# Altium schematic symbol library LATTICEPLDS_Library.SchLib: 291 symbols (part 22 of 32) (continued)
## LFEC6/10/15/20-F484/FN484
designator U?
footprint fpBGA484
part A pins: AA1 PL25/34/42/46A, AA2 PL25/34/42/46B, B1 PLNC/8/8/8A/LUM0_PLLT_IN_A, B2 PLNC/3/3/3B, C1 PLNC/8/8/8B/LUM0_PLLC_IN_A, C2 PLNC/5/5/5B, C3 PLNC/3/3/3A, D1 PLNC/11/15/15B, D2 PLNC/7/7/7B, D3 PLNC/5/5/5A, D4 PL2/2/2/2A/VREF2_7, E1 PLNC/11/15/15A, E2 PLNC/9/9/9B/LUM0_PLLC_FB_A, E3 PLNC/7/7/7A, E4 PL2/2/2/2B/VREF1_7, E5 PLNC/4/4/4A, F1 PLNC/NC/14/14B, F2 PLNC/NC/14/14A, F3 PLNC/9/9/9A/LUM0_PLLT_FB_A, F4 PLNC/6/6/6A/LDQS, F5 PLNC/4/4/4B, G1 PL4/13/17/17B, G2 PL3/12/16/16B, G3 PLNC/NC/12/12A, G4 PLNC/6/6/6B, G5 PLNC/NC/11/11A, H1 PL6/15/19/19B, H2 PL4/13/17/17A, H3 PL3/12/16/16A, H4 PLNC/NC/12/12B, H5 PLNC/NC/13/13B, H6 PLNC/NC/11/11B, J1 PL9/18/22/22A/PCLKT7_0, J2 PL6/15/19/19A/LDQS, J3 PL5/14/18/18B, J4 PL5/14/18/18A, J5 PLNC/NC/13/13A, J8 VCCO7 (power), K1 PL9/18/22/22B/PCLKC7_0, K2 PL8/17/21/21B, K3 PL8/17/21/21A, K4 PL7/16/20/20A, K5 PL7/16/20/20B, K8 VCCO7 (power), L1 PL12/21/25/25B, L2 PL12/21/25/25A, L4 PL11/20/24/24A, L5 PL11/20/24/24B, L7 VCCO7 (power), L8 VCCO7 (power), M1 PL14/23/27/27A, M2 PL14/23/27/27B, M3 PL15/24/28/28B, M4 PL13/22/26/26A, M5 PL13/22/26/26B, M7 VCCO6 (power), M8 VCCO6 (power), N1 PL17/26/30/30A, N2 PL17/26/30/30B, N3 LDQS/PL15/24/28/28A, N4 PL16/25/29/29B, N5 PL16/25/29/29A, N8 VCCO6 (power), P1 PL18/27/31/31A, P2 PL18/27/31/31B, P3 PLNC/NC/33/33A, P4 PLNC/NC/33/33B, P5 PLNC/NC/32/32B, P8 VCCO6 (power), R1 PLNC/NC/34/34A, R2 PLNC/NC/34/34B, R3 PLNC/NC/NC/37A, R4 PLNC/NC/35/35B, R5 PLNC/NC/35/35A, R6 PLNC/NC/32/32A, T1 LDQS/PLNC/NC/NC/36A, T2 PLNC/NC/NC/36B, T3 PLNC/NC/NC/37B, U3 LLM0_PLLT_FB_A/PL21/30/38/42A, U4 PL22/31/39/43A, V1 LLM0_PLLT_IN_A/PL20/29/37/41A, V2 LLM0_PLLC_IN_A/PL20/29/37/41B, V3 LLM0_PLLC_FB_A/PL21/30/38/42B, V4 PL26/35/43/47B, V5 PL22/31/39/43B, W1 PL23/32/40/44A, W2 PL23/32/40/44B, W3 VREF1_6/PL27/36/44/48A, W4 PL26/35/43/47A, Y1 LDQS/PL24/33/41/45A, Y2 PL24/33/41/45B, Y3 VREF2_6/PL27/36/44/48B
part B pins: AA3 PBNC/NC/5/13A, AA4 PBNC/NC/9/17A, AA5 PBNC/NC/7/15A, AA6 PB9/17/17/25A, AA7 PB10/18/18/26B, AA8 PB10/18/18/26A, AA9 PB14/22/22/30B, AA10 PB14/22/22/30A/BDQS, AA11 PB15/23/23/31B, AA12 D2/SPID5/PB21/29/29/37A, AA13 PB25/33/33/41A, AA14 PB26/34/34/42A, AA15 PB30/38/38/46B, AA16 PB31/39/39/47B, AA17 PB32/40/40/48B, AA18 PB33/41/41/49B, AA19 PBNC/NC/45/53B, AA20 PBNC/NC/47/55A, AB3 PBNC/NC/5/13B, AB4 PBNC/NC/9/17B, AB5 PB9/17/17/25B, AB6 PB11/19/19/27A, AB7 PB11/19/19/27B, AB8 PB13/21/21/29A, AB9 PB13/21/21/29B, AB10 PB17/25/25/33A/PCLKT5_0, AB11 PB17/25/25/33B/PCLKC5_0, AB12 D1/SPID6/PB21/29/29/37B, AB13 D6/SPID1/PB25/33/33/41B, AB14 PB29/37/37/45A, AB15 PB29/37/37/45B, AB16 BDQS/PB30/38/38/46A, AB17 PB31/39/39/47A, AB18 PB32/40/40/48A, AB19 PB33/41/41/49A, AB20 PBNC/NC/45/53A, R9 VCCO5 (power), R10 VCCO5 (power), R11 VCCO5 (power), R12 VCCO4 (power), R13 VCCO4 (power), R14 VCCO4 (power), T6 PBNC/NC/2/10B, T9 PB6/14/14/22B, T10 PB8/16/16/24B, T11 VCCO5 (power), T12 VCCO4 (power), T13 BDQS/PB22/30/30/38A, T14 PB28/36/36/44B, T17 PBNC/NC/49/57A, U6 PBNC/NC/4/12B, U7 PBNC/NC/3/11B, U8 PB3/11/11/19B, U9 PB4/12/12/20B, U10 PB7/15/15/23B, U11 CS1N/PB18/26/26/34B, U12 CSN/PB19/27/27/35B, U13 D0/SPID7/PB20/28/28/36B, U14 D4/SPID3/PB23/31/31/39B, U15 PBNC/NC/42/50B, U16 PBNC/NC/43/51B, U17 PBNC/NC/49/57B, V6 PBNC/NC/6/14B, V7 PBNC/NC/2/10A, V8 PBNC/NC/3/11A, V9 PB6/14/14/22A/BDQS, V10 PB8/16/16/24A, V11 PB16/24/24/32A/VREF2_5, V12 PB16/24/24/32B/VREF1_5, V13 D3/SPID4/PB22/30/30/38B, V14 D5/SPID2/PB24/32/32/40B, V15 PB28/36/36/44A, V16 PBNC/NC/43/51A, V17 PBNC/NC/44/52B, W5 PBNC/NC/4/12A, W6 PBNC/NC/7/15B, W7 PB3/11/11/19A, W8 PB2/10/10/18B, W9 PB4/12/12/20A, W10 PB7/15/15/23A, W11 PB12/20/20/28B, W12 VREF1_4/PB19/27/27/35A, W13 VREF2_4/PB20/28/28/36A, W14 PB23/31/31/39A, W15 PB27/35/35/43B, W16 PBNC/NC/42/50A, W17 PBNC/NC/46/54B, W18 PBNC/NC/48/56B, Y4 PBNC/NC/8/16B, Y5 PBNC/NC/8/16A, Y6 PBNC/NC/6/14A/BDQS, Y7 PB2/10/10/18A, Y8 PB5/13/13/21A, Y9 PB5/13/13/21B, Y10 PB12/20/20/28A, Y11 PB15/23/23/31A, Y12 WRITEN/PB18/26/26/34A, Y13 PB24/32/32/40A, Y14 PB26/34/34/42B, Y15 PB27/35/35/43A, Y16 BDQS/PBNC/NC/46/54A, Y17 PBNC/NC/44/52A, Y18 PBNC/NC/48/56A, Y19 PBNC/NC/47/55B
part C pins: AA21 PR26/35/43/47B, AA22 PR24/33/41/45A/RDQS, AB21 PR26/35/43/47A, B21 PRNC/3/3/3A, B22 PRNC/3/3/3B, C20 PRNC/5/5/5A, C21 PRNC/5/5/5B, C22 RUM0_PLLT_FB_A/PRNC/9/9/9A, D19 VREF2_2/PR2/2/2/2A, D20 RDQS/PRNC/6/6/6A, D21 RUM0_PLLC_FB_A/PRNC/9/9/9B, D22 PRNC/11/15/15A, E18 PRNC/4/4/4A, E19 VREF1_2/PR2/2/2/2B, E20 PRNC/6/6/6B, E21 PRNC/11/15/15B, E22 PR3/12/16/16A, F18 PRNC/4/4/4B, F19 PRNC/7/7/7A, F20 PRNC/7/7/7B, F21 PR3/12/16/16B, F22 PR4/13/17/17A, G18 RUM0_PLLT_IN_A/PRNC/8/8/8A, G19 RUM0_PLLC_IN_A/PRNC/8/8/8B, G20 PRNC/NC/14/14A, G21 PRNC/NC/14/14B, G22 PR4/13/17/17B, H17 PRNC/NC/11/11B, H18 PRNC/NC/11/11A, H19 PRNC/NC/13/13A, H20 PRNC/NC/12/12A, H21 PR8/17/21/21A, H22 PR8/17/21/21B, J15 VCCO2 (power), J18 PRNC/NC/13/13B, J19 PRNC/NC/12/12B, J20 RDQS/PR6/15/19/19A, J21 PCLKT2_0/PR9/18/22/22A, J22 PCLKC2_0/PR9/18/22/22B, K15 VCCO2 (power), K18 PR5/14/18/18A, K19 PR5/14/18/18B, K20 PR6/15/19/19B, K21 PR11/20/24/24A, K22 PR11/20/24/24B, L15 VCCO2 (power), L16 VCCO2 (power), L18 PR7/16/20/20A, L19 PR7/16/20/20B, L20 PR15/24/28/28A/RDQS, L21 PR14/23/27/27B, L22 PR12/21/25/25A, M15 VCCO3 (power), M16 VCCO3 (power), M18 PR13/22/26/26B, M19 PR13/22/26/26A, M20 PR14/23/27/27A, M21 PR15/24/28/28B, M22 PR12/21/25/25B, N15 VCCO3 (power), N18 PR16/25/29/29A, N19 PR16/25/29/29B, N20 PRNC/NC/33/33A, N21 PR17/26/30/30B, N22 PR17/26/30/30A, P15 VCCO3 (power), P18 PRNC/NC/32/32A, P19 PRNC/NC/32/32B, P20 PRNC/NC/33/33B, P21 PR18/27/31/31B, P22 PR18/27/31/31A, R17 PRNC/NC/NC/37A, R18 PRNC/NC/NC/36A/RDQS, R19 PRNC/NC/NC/36B, R21 PRNC/NC/34/34B, R22 PRNC/NC/34/34A, T18 PRNC/NC/NC/37B, T22 PRNC/NC/35/35A, U20 PR23/32/40/44A/RLM0_PLLT_FB_A, U21 PR20/29/37/41B/BUSY, U22 PRNC/NC/35/35B, V19 PR25/34/42/46A, V20 PR23/32/40/44B/RLM0_PLLC_FB_A, V21 PR21/30/38/42B/DIN, V22 PR20/29/37/41A/D7/SPID0, W19 PR25/34/42/46B, W20 PR27/36/44/48B/VREF2_3, W21 PR22/31/39/43B/RLM0_PLLC_IN_A, W22 PR21/30/38/42A/DOUT/CSOB, Y20 PR27/36/44/48A/VREF1_3, Y21 PR24/33/41/45B, Y22 PR22/31/39/43A/RLM0_PLLT_IN_A
part D pins: A3 PTNC/5/5/13B, A4 PTNC/9/9/17B, A5 PT9/17/17/25B, A6 PT11/19/19/27A, A7 PT11/19/19/27B, A8 PT13/21/21/29A, A9 PT13/21/21/29B, A10 PCLKT0_0/PT17/25/25/33A, A11 PCLKC0_0/PT17/25/25/33B, A12 PT21/29/29/37B, A13 PT25/33/33/41B, A14 PT29/37/37/45A, A15 PT29/37/37/45B, A16 PT30/38/38/46A/TDQS, A17 PT31/39/39/47A, A18 PT32/40/40/48A, A19 PT33/41/41/49A, A20 PTNC/NC/45/53A, B3 PTNC/5/5/13A, B4 PTNC/9/9/17A, B5 PTNC/7/7/15A, B6 PT9/17/17/25A, B7 PT10/18/18/26B, B8 PT10/18/18/26A, B9 PT14/22/22/30B, B10 TDQS/PT14/22/22/30A, B11 PT15/23/23/31B, B12 PT21/29/29/37A, B13 PT25/33/33/41A, B14 PT26/34/34/42A, B15 PT30/38/38/46B, B16 PT31/39/39/47B, B17 PT32/40/40/48B, B18 PT33/41/41/49B, B19 PTNC/NC/45/53B, B20 PTNC/NC/47/55A, C4 PTNC/8/8/16B, C5 PTNC/8/8/16A, C6 TDQS/PTNC/6/6/14A, C7 PT2/10/10/18A, C8 PT5/13/13/21A, C9 PT5/13/13/21B, C10 PT12/20/20/28A, C11 PT15/23/23/31A, C12 PT18/26/26/34A, C13 PT24/32/32/40A, C14 PT26/34/34/42B, C15 PT27/35/35/43A, C16 PTNC/NC/46/54A/TDQS, C17 PTNC/NC/44/52A, C18 PTNC/NC/48/56A, C19 PTNC/NC/47/55B, D5 PTNC/4/4/12A, D6 PTNC/7/7/15B, D7 PT3/11/11/19A, D8 PT2/10/10/18B, D9 PT4/12/12/20A, D10 PT7/15/15/23A, D11 PT12/20/20/28B, D12 PT19/27/27/35A/VREF1_1, D13 PT20/28/28/36A, D14 PT23/31/31/39A, D15 PT27/35/35/43B, D16 PTNC/NC/42/50A, D17 PTNC/NC/46/54B, D18 PTNC/NC/48/56B, E6 PTNC/6/6/14B, E7 PTNC/2/2/10A, E8 PTNC/3/3/11A, E9 TDQS/PT6/14/14/22A, E10 PT8/16/16/24A, E11 VREF2_0/PT16/24/24/32A, E12 VREF1_0/PT16/24/24/32B, E13 PT22/30/30/38B, E14 PT24/32/32/40B, E15 PT28/36/36/44A, E16 PTNC/NC/43/51A, E17 PTNC/NC/44/52B, F6 PTNC/4/4/12B, F7 PTNC/3/3/11B, F8 PT3/11/11/19B, F9 PT4/12/12/20B, F10 PT7/15/15/23B, F11 PT18/26/26/34B, F12 PT19/27/27/35B/VREF2_1, F13 PT20/28/28/36B, F14 PT23/31/31/39B, F15 PTNC/NC/42/50B, F16 PTNC/NC/43/51B, F17 PTNC/NC/49/57A, G6 PTNC/2/2/10B, G9 PT6/14/14/22B, G10 PT8/16/16/24B, G11 VCCO0 (power), G12 VCCO1 (power), G13 PT22/30/30/38A/TDQS, G14 PT28/36/36/44B, G17 PTNC/NC/49/57B, H9 VCCO0 (power), H10 VCCO0 (power), H11 VCCO0 (power), H12 VCCO1 (power), H13 VCCO1 (power), H14 VCCO1 (power)
part E pins: A1 GND (power), A22 GND (power), AB1 GND (power), AB22 GND (power), G7 VCCAUX (power), G8 VCCAUX (power), G15 VCCAUX (power), G16 VCCAUX (power), H7 VCCAUX (power), H8 GND (power), H15 GND (power), H16 VCCAUX (power), J6 VCC CORE (power), J7 VCC CORE (power), J9 GND (power), J10 GND (power), J11 GND (power), J12 GND (power), J13 GND (power), J14 GND (power), J16 VCC CORE (power), J17 VCC CORE (power), K6 VCC CORE (power), K7 VCC CORE (power), K9 GND (power), K10 GND (power), K11 GND (power), K12 GND (power), K13 GND (power), K14 GND (power), K16 VCC CORE (power), K17 VCC CORE (power), L3 XRES (10K 1% to GND), L6 VCC CORE (power), L9 GND (power), L10 GND (power), L11 GND (power), L12 GND (power), L13 GND (power), L14 GND (power), L17 VCC CORE (power), M6 VCC CORE (power), M9 GND (power), M10 GND (power), M11 GND (power), M12 GND (power), M13 GND (power), M14 GND (power), M17 VCC CORE (power), N6 VCC CORE (power), N7 VCC CORE (power), N9 GND (power), N10 GND (power), N11 GND (power), N12 GND (power), N13 GND (power), N14 GND (power), N16 VCC CORE (power), N17 VCC CORE (power), P6 VCC CORE (power), P7 VCC CORE (power), P9 GND (power), P10 GND (power), P11 GND (power), P12 GND (power), P13 GND (power), P14 GND (power), P16 VCC CORE (power), P17 VCC CORE (power), R7 VCCAUX (power), R8 GND (power), R15 GND (power), R16 VCCAUX (power), R20 DONE, T4 TMS, T5 TCK, T7 VCCAUX (power), T8 VCCAUX (power), T15 VCCAUX (power), T16 VCCAUX (power), T19 CFG2, T20 CCLK, T21 INITN, U1 TDO, U2 VCCJ, U5 TDI, U18 CFG0, U19 CFG1, V18 PROGRAMN
part A text: BANK7; (1 of 5); BANK6; DQS Group; Pad Name = PL{EC6/EC10/EC15/EC20}
part B text: BANK5; (2 of 5); BANK4; DQS Group; Pad Name = PB{EC6/EC10/EC15/EC20}
part C text: BANK3; (3 of 5); BANK2; DQS Group; Pad Name = PR{EC6/EC10/EC15/EC20}
part D text: BANK1; (4 of 5); BANK0; DQS Group; Pad Name = PT{EC6/EC10/EC15/EC20}
part E text: (5 of 5)

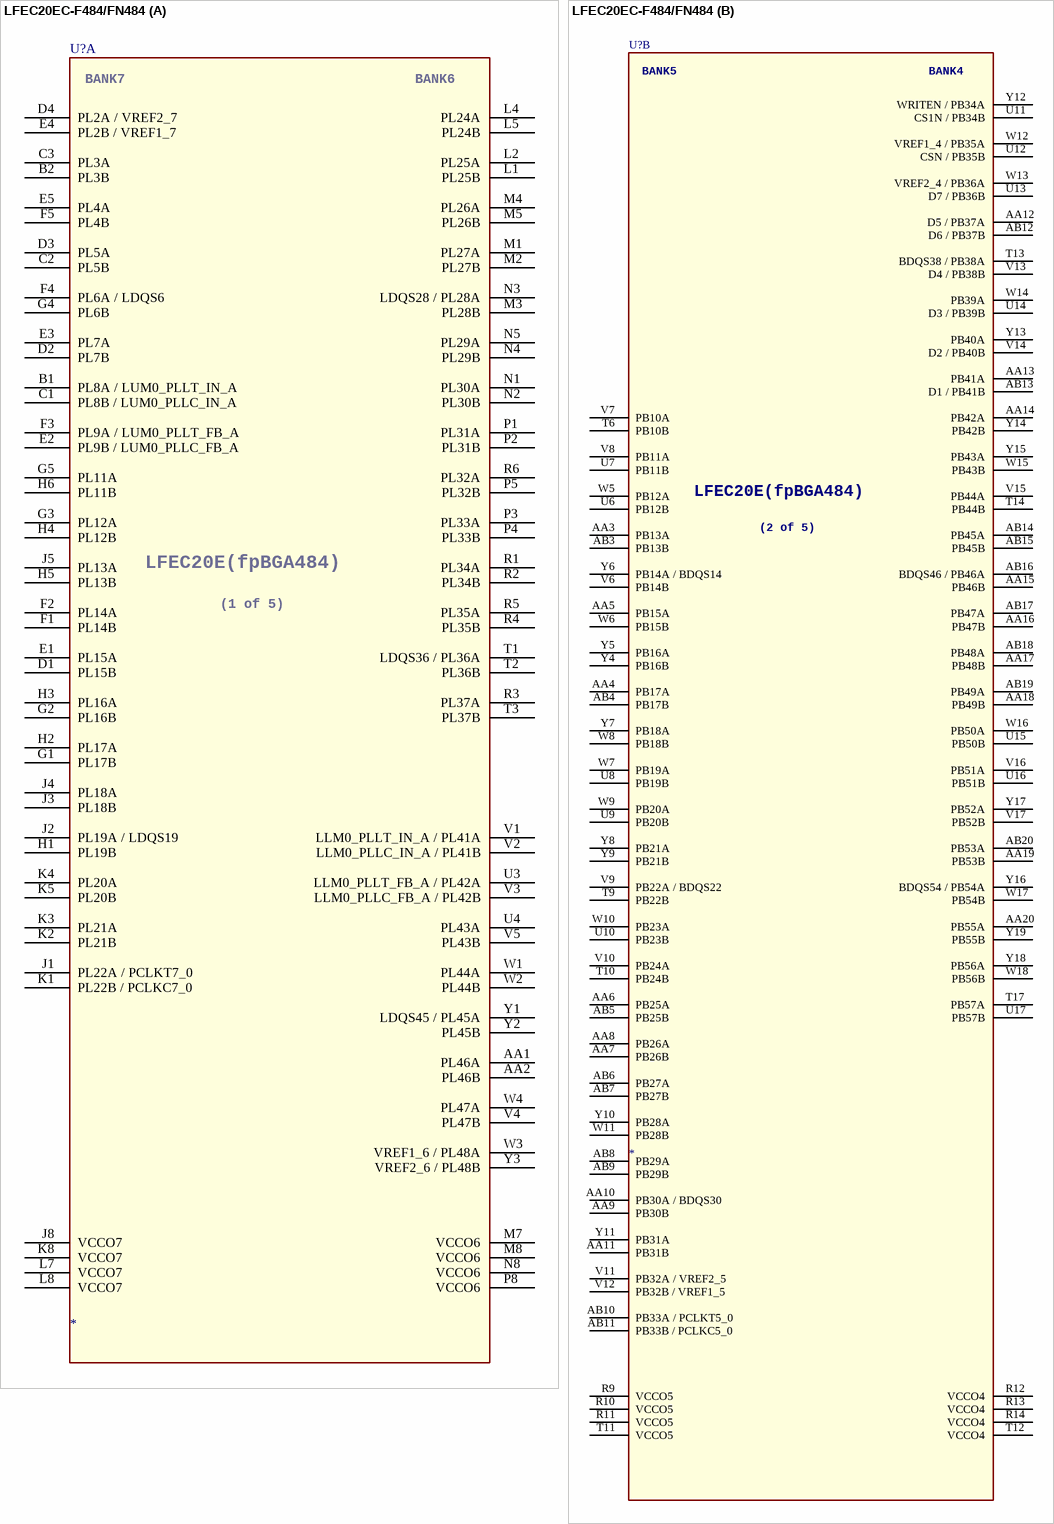
[diagram p214: symbol LFEC20EC-F484/FN484]

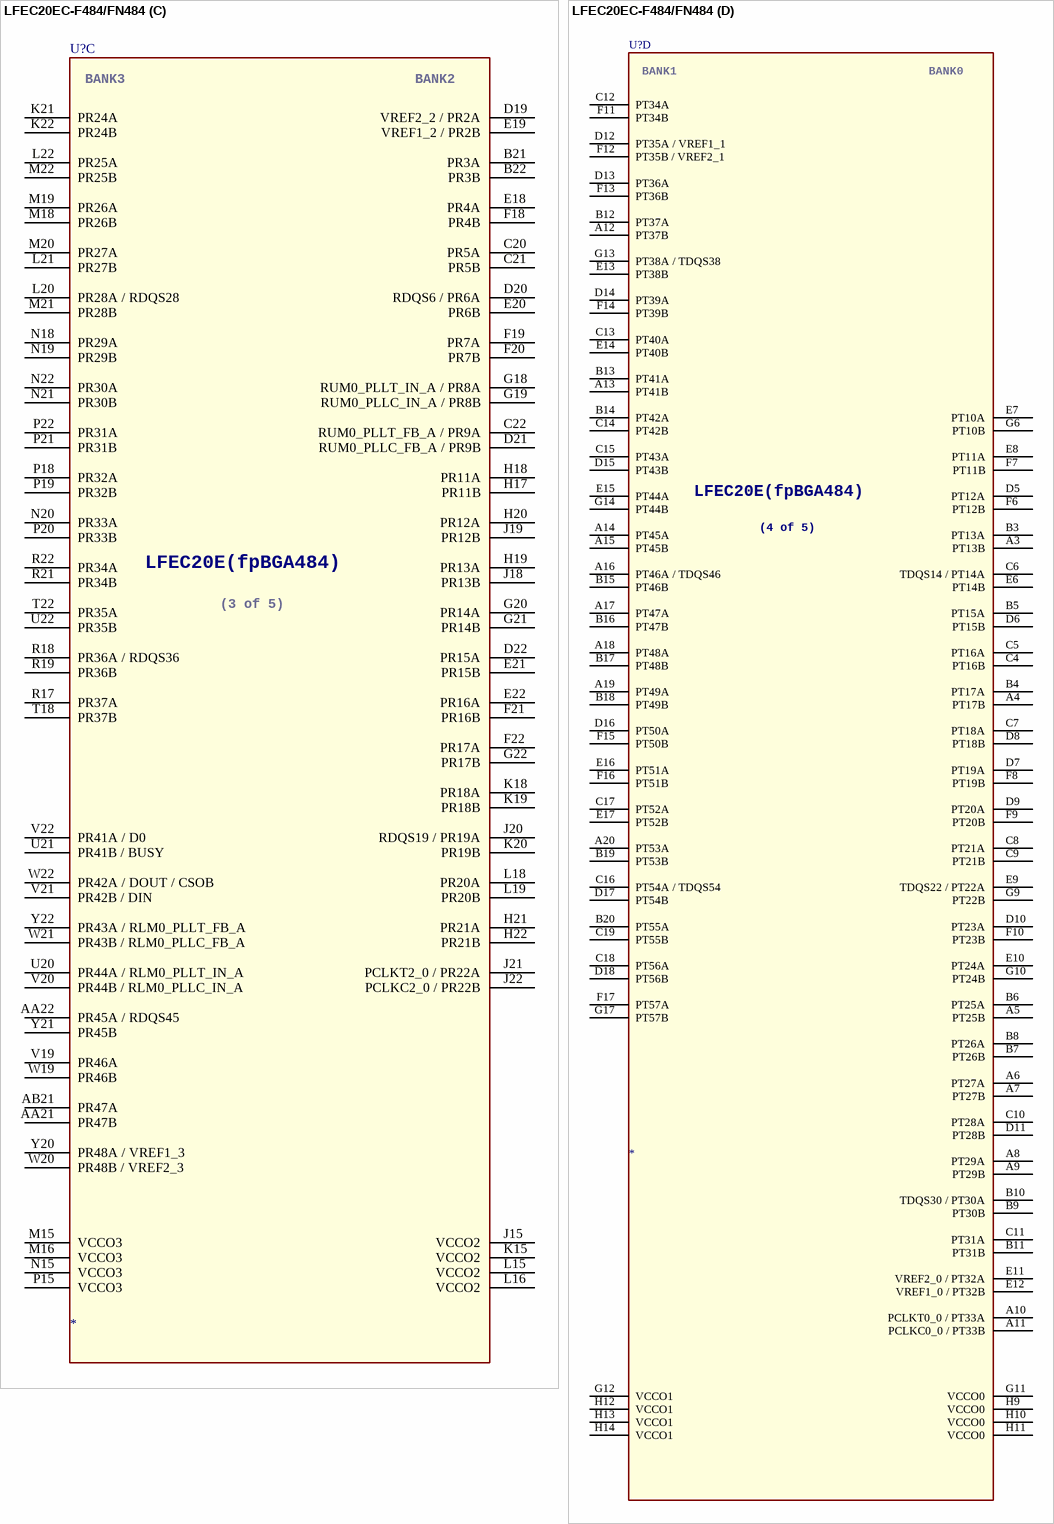
[diagram p215: symbol LFEC20EC-F484/FN484]

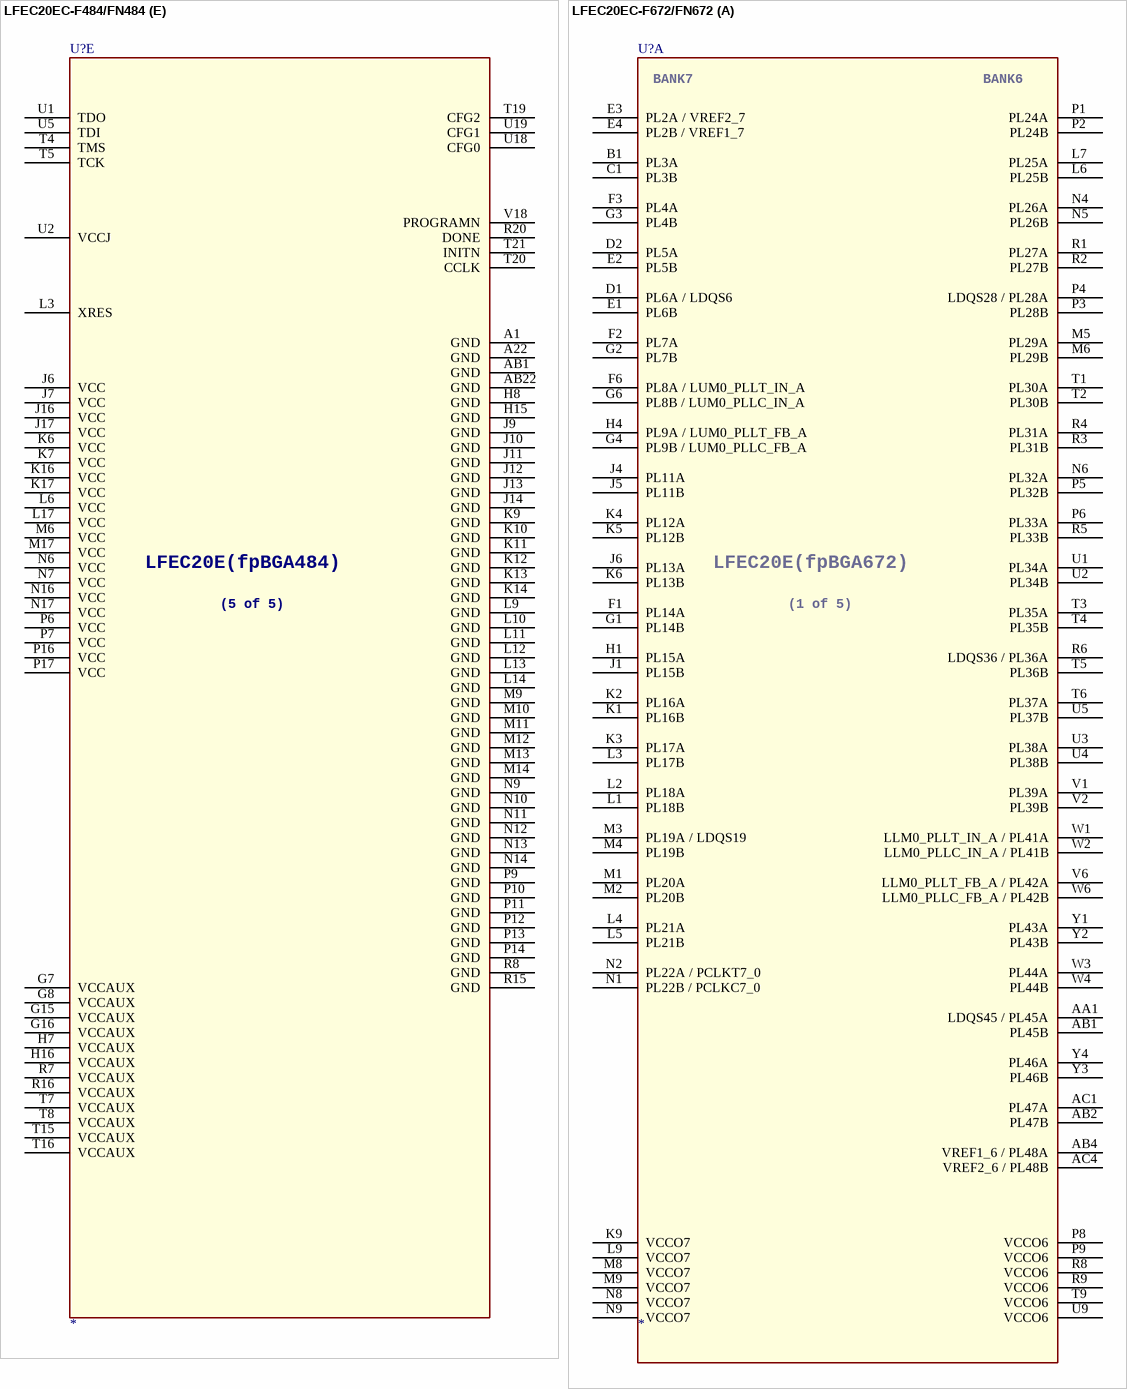
[diagram p216: symbols LFEC20EC-F484/FN484 to LFEC20EC-F672/FN672]

## LFEC20EC-F484/FN484
designator U?
part A pins: AA1 PL46A, AA2 PL46B, B1 PL8A / LUM0_PLLT_IN_A, B2 PL3B, C1 PL8B / LUM0_PLLC_IN_A, C2 PL5B, C3 PL3A, D1 PL15B, D2 PL7B, D3 PL5A, D4 PL2A / VREF2_7, E1 PL15A, E2 PL9B / LUM0_PLLC_FB_A, E3 PL7A, E4 PL2B / VREF1_7, E5 PL4A, F1 PL14B, F2 PL14A, F3 PL9A / LUM0_PLLT_FB_A, F4 PL6A / LDQS6, F5 PL4B, G1 PL17B, G2 PL16B, G3 PL12A, G4 PL6B, G5 PL11A, H1 PL19B, H2 PL17A, H3 PL16A, H4 PL12B, H5 PL13B, H6 PL11B, J1 PL22A / PCLKT7_0, J2 PL19A / LDQS19, J3 PL18B, J4 PL18A, J5 PL13A, J8 VCCO7 (power), K1 PL22B / PCLKC7_0, K2 PL21B, K3 PL21A, K4 PL20A, K5 PL20B, K8 VCCO7 (power), L1 PL25B, L2 PL25A, L4 PL24A, L5 PL24B, L7 VCCO7 (power), L8 VCCO7 (power), M1 PL27A, M2 PL27B, M3 PL28B, M4 PL26A, M5 PL26B, M7 VCCO6 (power), M8 VCCO6 (power), N1 PL30A, N2 PL30B, N3 LDQS28 / PL28A, N4 PL29B, N5 PL29A, N8 VCCO6 (power), P1 PL31A, P2 PL31B, P3 PL33A, P4 PL33B, P5 PL32B, P8 VCCO6 (power), R1 PL34A, R2 PL34B, R3 PL37A, R4 PL35B, R5 PL35A, R6 PL32A, T1 LDQS36 / PL36A, T2 PL36B, T3 PL37B, U3 LLM0_PLLT_FB_A / PL42A, U4 PL43A, V1 LLM0_PLLT_IN_A / PL41A, V2 LLM0_PLLC_IN_A / PL41B, V3 LLM0_PLLC_FB_A / PL42B, V4 PL47B, V5 PL43B, W1 PL44A, W2 PL44B, W3 VREF1_6 / PL48A, W4 PL47A, Y1 LDQS45 / PL45A, Y2 PL45B, Y3 VREF2_6 / PL48B
part B pins: AA3 PB13A, AA4 PB17A, AA5 PB15A, AA6 PB25A, AA7 PB26B, AA8 PB26A, AA9 PB30B, AA10 PB30A / BDQS30, AA11 PB31B, AA12 D5 / PB37A, AA13 PB41A, AA14 PB42A, AA15 PB46B, AA16 PB47B, AA17 PB48B, AA18 PB49B, AA19 PB53B, AA20 PB55A, AB3 PB13B, AB4 PB17B, AB5 PB25B, AB6 PB27A, AB7 PB27B, AB8 PB29A, AB9 PB29B, AB10 PB33A / PCLKT5_0, AB11 PB33B / PCLKC5_0, AB12 D6 / PB37B, AB13 D1 / PB41B, AB14 PB45A, AB15 PB45B, AB16 BDQS46 / PB46A, AB17 PB47A, AB18 PB48A, AB19 PB49A, AB20 PB53A, R9 VCCO5 (power), R10 VCCO5 (power), R11 VCCO5 (power), R12 VCCO4 (power), R13 VCCO4 (power), R14 VCCO4 (power), T6 PB10B, T9 PB22B, T10 PB24B, T11 VCCO5 (power), T12 VCCO4 (power), T13 BDQS38 / PB38A, T14 PB44B, T17 PB57A, U6 PB12B, U7 PB11B, U8 PB19B, U9 PB20B, U10 PB23B, U11 CS1N / PB34B, U12 CSN / PB35B, U13 D7 / PB36B, U14 D3 / PB39B, U15 PB50B, U16 PB51B, U17 PB57B, V6 PB14B, V7 PB10A, V8 PB11A, V9 PB22A / BDQS22, V10 PB24A, V11 PB32A / VREF2_5, V12 PB32B / VREF1_5, V13 D4 / PB38B, V14 D2 / PB40B, V15 PB44A, V16 PB51A, V17 PB52B, W5 PB12A, W6 PB15B, W7 PB19A, W8 PB18B, W9 PB20A, W10 PB23A, W11 PB28B, W12 VREF1_4 / PB35A, W13 VREF2_4 / PB36A, W14 PB39A, W15 PB43B, W16 PB50A, W17 PB54B, W18 PB56B, Y4 PB16B, Y5 PB16A, Y6 PB14A / BDQS14, Y7 PB18A, Y8 PB21A, Y9 PB21B, Y10 PB28A, Y11 PB31A, Y12 WRITEN / PB34A, Y13 PB40A, Y14 PB42B, Y15 PB43A, Y16 BDQS54 / PB54A, Y17 PB52A, Y18 PB56A, Y19 PB55B
part C pins: AA21 PR47B, AA22 PR45A / RDQS45, AB21 PR47A, B21 PR3A, B22 PR3B, C20 PR5A, C21 PR5B, C22 RUM0_PLLT_FB_A / PR9A, D19 VREF2_2 / PR2A, D20 RDQS6 / PR6A, D21 RUM0_PLLC_FB_A / PR9B, D22 PR15A, E18 PR4A, E19 VREF1_2 / PR2B, E20 PR6B, E21 PR15B, E22 PR16A, F18 PR4B, F19 PR7A, F20 PR7B, F21 PR16B, F22 PR17A, G18 RUM0_PLLT_IN_A / PR8A, G19 RUM0_PLLC_IN_A / PR8B, G20 PR14A, G21 PR14B, G22 PR17B, H17 PR11B, H18 PR11A, H19 PR13A, H20 PR12A, H21 PR21A, H22 PR21B, J15 VCCO2 (power), J18 PR13B, J19 PR12B, J20 RDQS19 / PR19A, J21 PCLKT2_0 / PR22A, J22 PCLKC2_0 / PR22B, K15 VCCO2 (power), K18 PR18A, K19 PR18B, K20 PR19B, K21 PR24A, K22 PR24B, L15 VCCO2 (power), L16 VCCO2 (power), L18 PR20A, L19 PR20B, L20 PR28A / RDQS28, L21 PR27B, L22 PR25A, M15 VCCO3 (power), M16 VCCO3 (power), M18 PR26B, M19 PR26A, M20 PR27A, M21 PR28B, M22 PR25B, N15 VCCO3 (power), N18 PR29A, N19 PR29B, N20 PR33A, N21 PR30B, N22 PR30A, P15 VCCO3 (power), P18 PR32A, P19 PR32B, P20 PR33B, P21 PR31B, P22 PR31A, R17 PR37A, R18 PR36A / RDQS36, R19 PR36B, R21 PR34B, R22 PR34A, T18 PR37B, T22 PR35A, U20 PR44A / RLM0_PLLT_IN_A, U21 PR41B / BUSY, U22 PR35B, V19 PR46A, V20 PR44B / RLM0_PLLC_IN_A, V21 PR42B / DIN, V22 PR41A / D0, W19 PR46B, W20 PR48B / VREF2_3, W21 PR43B / RLM0_PLLC_FB_A, W22 PR42A / DOUT / CSOB, Y20 PR48A / VREF1_3, Y21 PR45B, Y22 PR43A / RLM0_PLLT_FB_A
part D pins: A3 PT13B, A4 PT17B, A5 PT25B, A6 PT27A, A7 PT27B, A8 PT29A, A9 PT29B, A10 PCLKT0_0 / PT33A, A11 PCLKC0_0 / PT33B, A12 PT37B, A13 PT41B, A14 PT45A, A15 PT45B, A16 PT46A / TDQS46, A17 PT47A, A18 PT48A, A19 PT49A, A20 PT53A, B3 PT13A, B4 PT17A, B5 PT15A, B6 PT25A, B7 PT26B, B8 PT26A, B9 PT30B, B10 TDQS30 / PT30A, B11 PT31B, B12 PT37A, B13 PT41A, B14 PT42A, B15 PT46B, B16 PT47B, B17 PT48B, B18 PT49B, B19 PT53B, B20 PT55A, C4 PT16B, C5 PT16A, C6 TDQS14 / PT14A, C7 PT18A, C8 PT21A, C9 PT21B, C10 PT28A, C11 PT31A, C12 PT34A, C13 PT40A, C14 PT42B, C15 PT43A, C16 PT54A / TDQS54, C17 PT52A, C18 PT56A, C19 PT55B, D5 PT12A, D6 PT15B, D7 PT19A, D8 PT18B, D9 PT20A, D10 PT23A, D11 PT28B, D12 PT35A / VREF1_1, D13 PT36A, D14 PT39A, D15 PT43B, D16 PT50A, D17 PT54B, D18 PT56B, E6 PT14B, E7 PT10A, E8 PT11A, E9 TDQS22 / PT22A, E10 PT24A, E11 VREF2_0 / PT32A, E12 VREF1_0 / PT32B, E13 PT38B, E14 PT40B, E15 PT44A, E16 PT51A, E17 PT52B, F6 PT12B, F7 PT11B, F8 PT19B, F9 PT20B, F10 PT23B, F11 PT34B, F12 PT35B / VREF2_1, F13 PT36B, F14 PT39B, F15 PT50B, F16 PT51B, F17 PT57A, G6 PT10B, G9 PT22B, G10 PT24B, G11 VCCO0 (power), G12 VCCO1 (power), G13 PT38A / TDQS38, G14 PT44B, G17 PT57B, H9 VCCO0 (power), H10 VCCO0 (power), H11 VCCO0 (power), H12 VCCO1 (power), H13 VCCO1 (power), H14 VCCO1 (power)
part E pins: A1 GND (power), A22 GND (power), AB1 GND (power), AB22 GND (power), G7 VCCAUX (power), G8 VCCAUX (power), G15 VCCAUX (power), G16 VCCAUX (power), H7 VCCAUX (power), H8 GND (power), H15 GND (power), H16 VCCAUX (power), J6 VCC (power), J7 VCC (power), J9 GND (power), J10 GND (power), J11 GND (power), J12 GND (power), J13 GND (power), J14 GND (power), J16 VCC (power), J17 VCC (power), K6 VCC (power), K7 VCC (power), K9 GND (power), K10 GND (power), K11 GND (power), K12 GND (power), K13 GND (power), K14 GND (power), K16 VCC (power), K17 VCC (power), L3 XRES, L6 VCC (power), L9 GND (power), L10 GND (power), L11 GND (power), L12 GND (power), L13 GND (power), L14 GND (power), L17 VCC (power), M6 VCC (power), M9 GND (power), M10 GND (power), M11 GND (power), M12 GND (power), M13 GND (power), M14 GND (power), M17 VCC (power), N6 VCC (power), N7 VCC (power), N9 GND (power), N10 GND (power), N11 GND (power), N12 GND (power), N13 GND (power), N14 GND (power), N16 VCC (power), N17 VCC (power), P6 VCC (power), P7 VCC (power), P9 GND (power), P10 GND (power), P11 GND (power), P12 GND (power), P13 GND (power), P14 GND (power), P16 VCC (power), P17 VCC (power), R7 VCCAUX (power), R8 GND (power), R15 GND (power), R16 VCCAUX (power), R20 DONE, T4 TMS, T5 TCK, T7 VCCAUX (power), T8 VCCAUX (power), T15 VCCAUX (power), T16 VCCAUX (power), T19 CFG2, T20 CCLK, T21 INITN, U1 TDO, U2 VCCJ, U5 TDI, U18 CFG0, U19 CFG1, V18 PROGRAMN
part A text: BANK7; BANK6; LFEC20E(fpBGA484); (1 of 5)
part B text: BANK5; BANK4; LFEC20E(fpBGA484); (2 of 5)
part C text: BANK3; BANK2; LFEC20E(fpBGA484); (3 of 5)
part D text: BANK1; BANK0; LFEC20E(fpBGA484); (4 of 5)
part E text: LFEC20E(fpBGA484); (5 of 5)

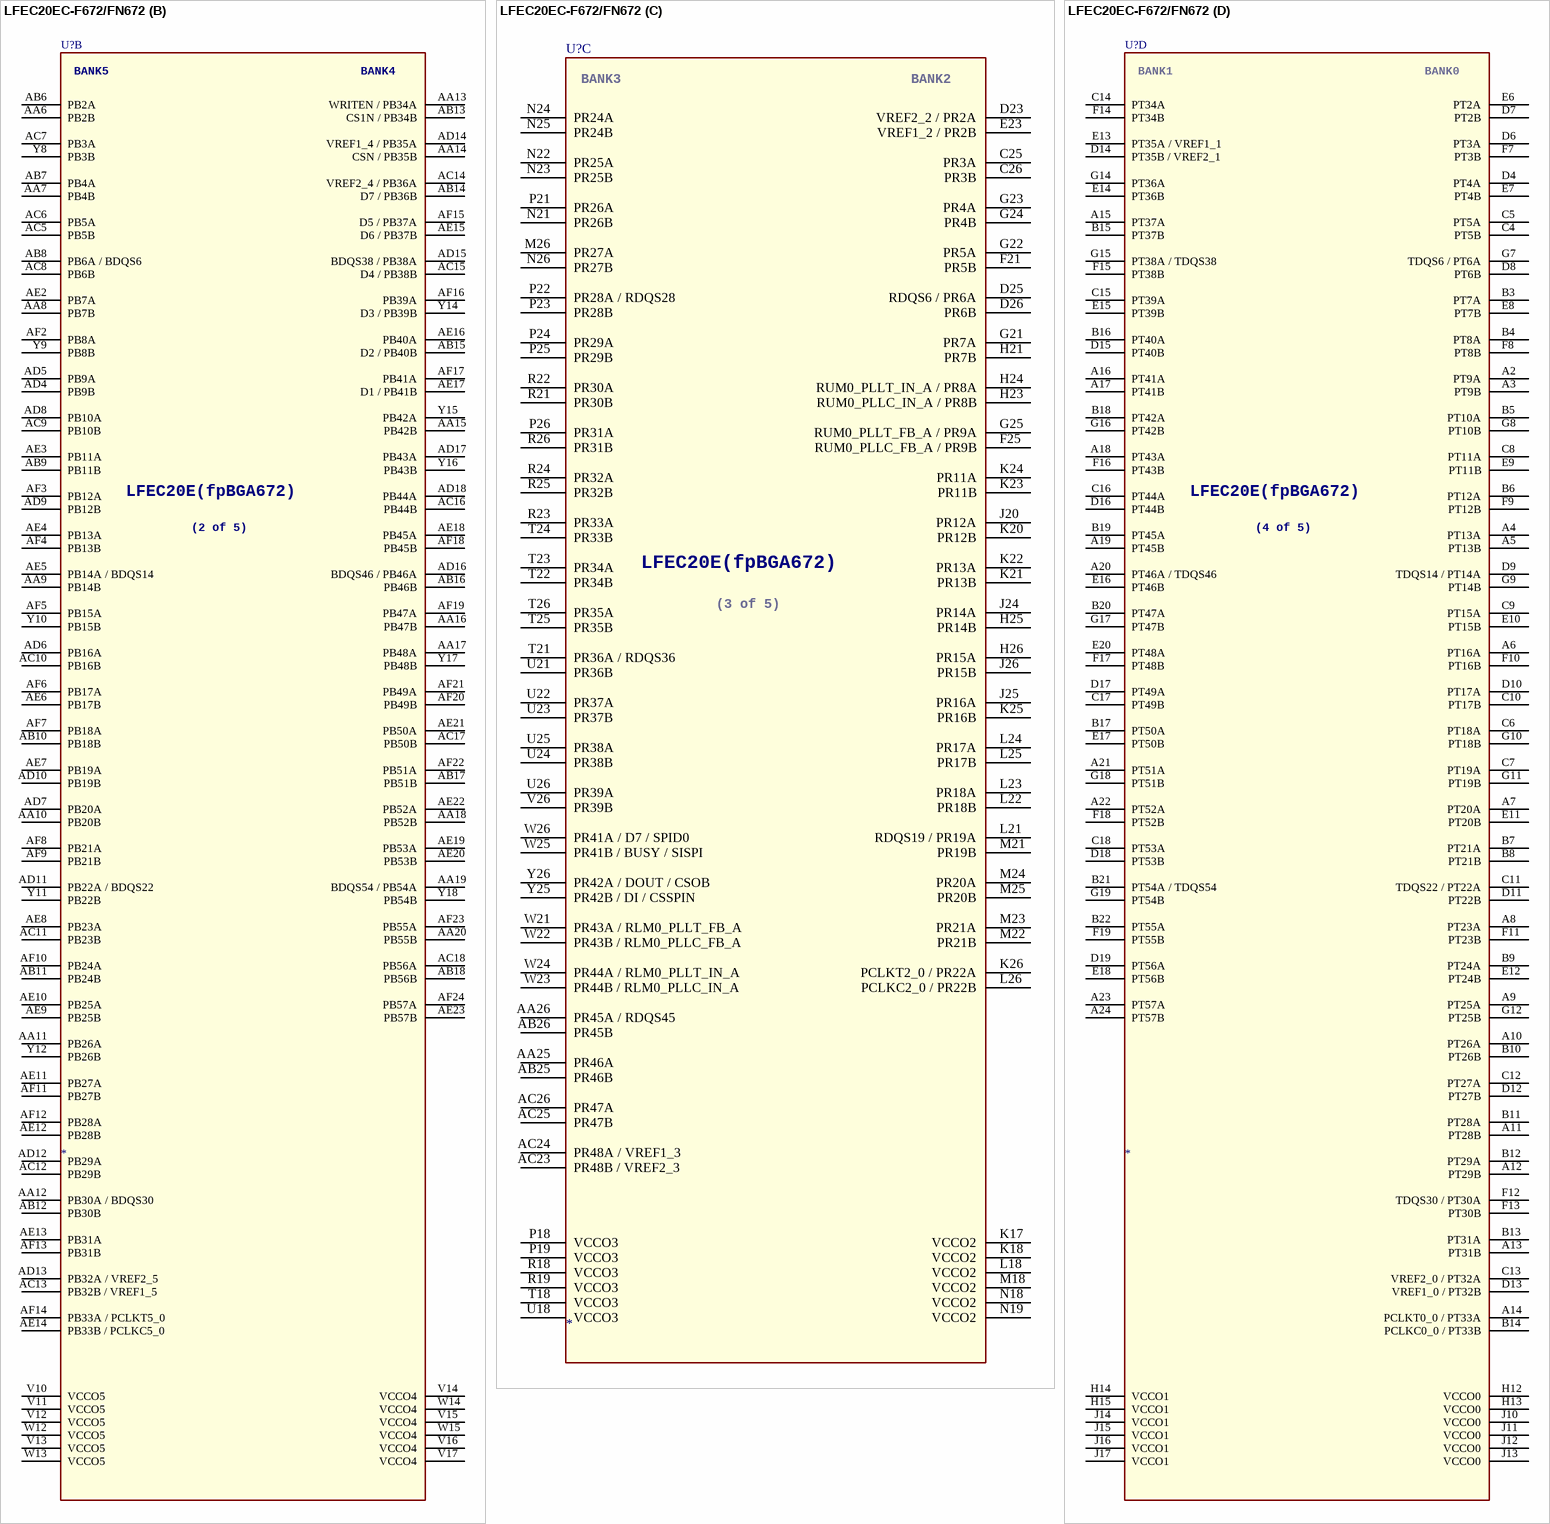
[diagram p217: symbol LFEC20EC-F672/FN672]

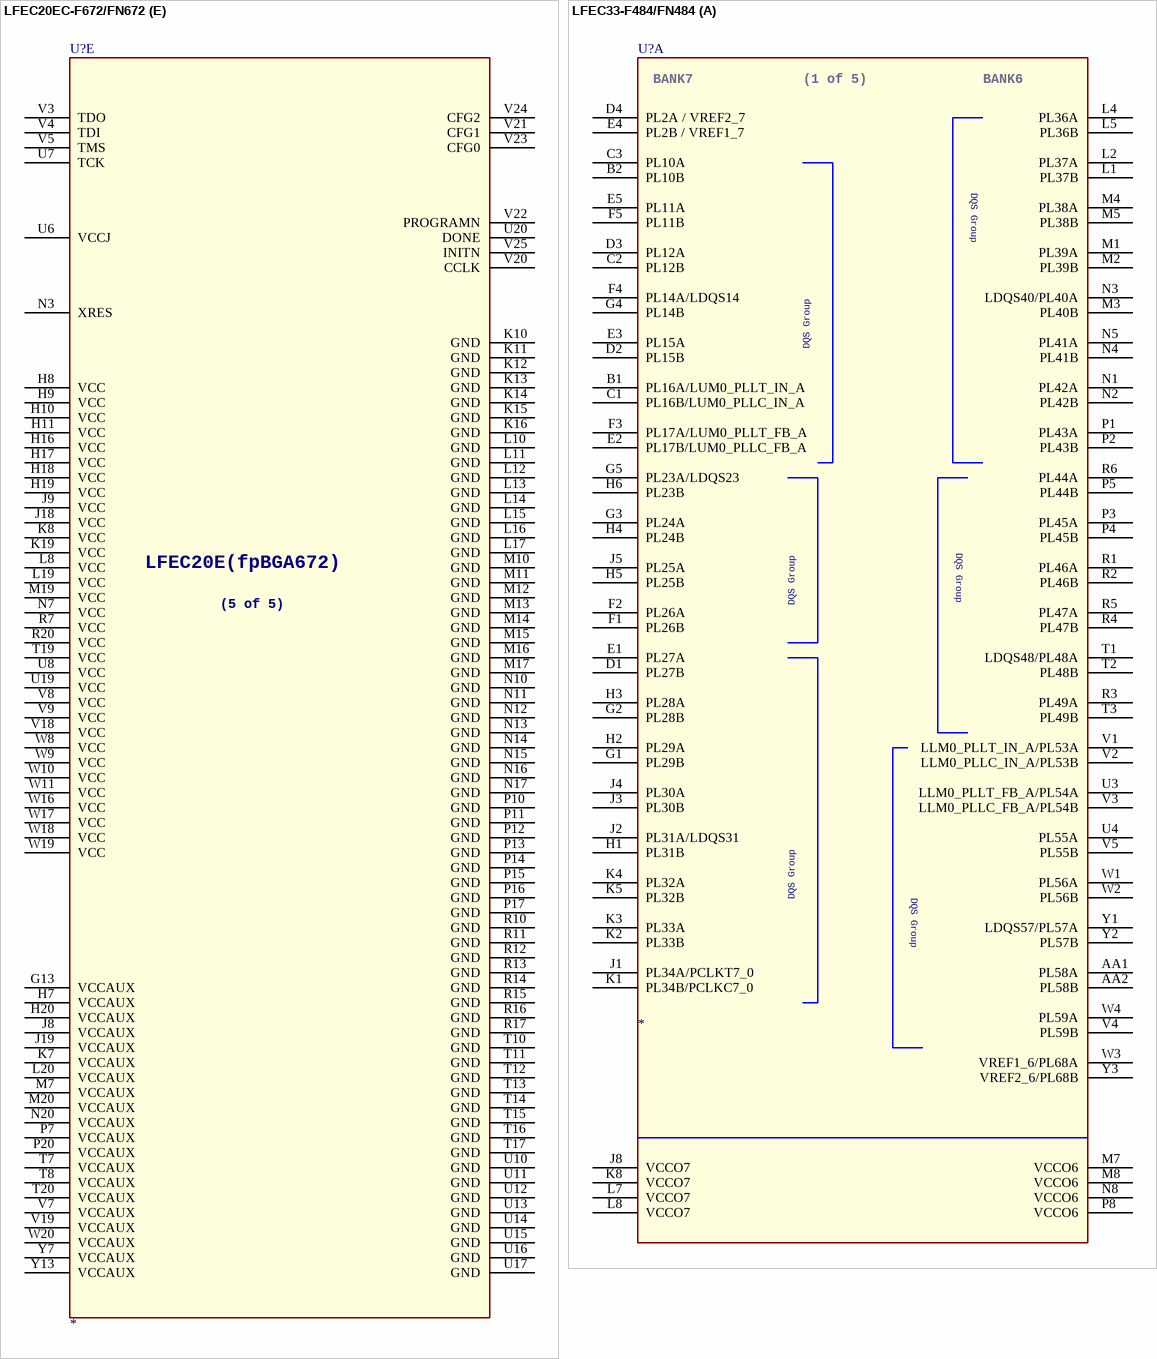
[diagram p218: symbols LFEC20EC-F672/FN672 to LFEC33-F484/FN484]